# Altium footprint library mastermind.PCBLIB: 1061 footprints (part 10 of 67)
Each footprint in its own frame and in the unit in brackets; x right, y up, seen from the top. Pads: shape width x height; smd on the part's side, far side on the other; paste and mask are expansions set on the pad; w line width, h text height; cw(c..) or ccw(c..) is an arc to the next point about the centre after c.
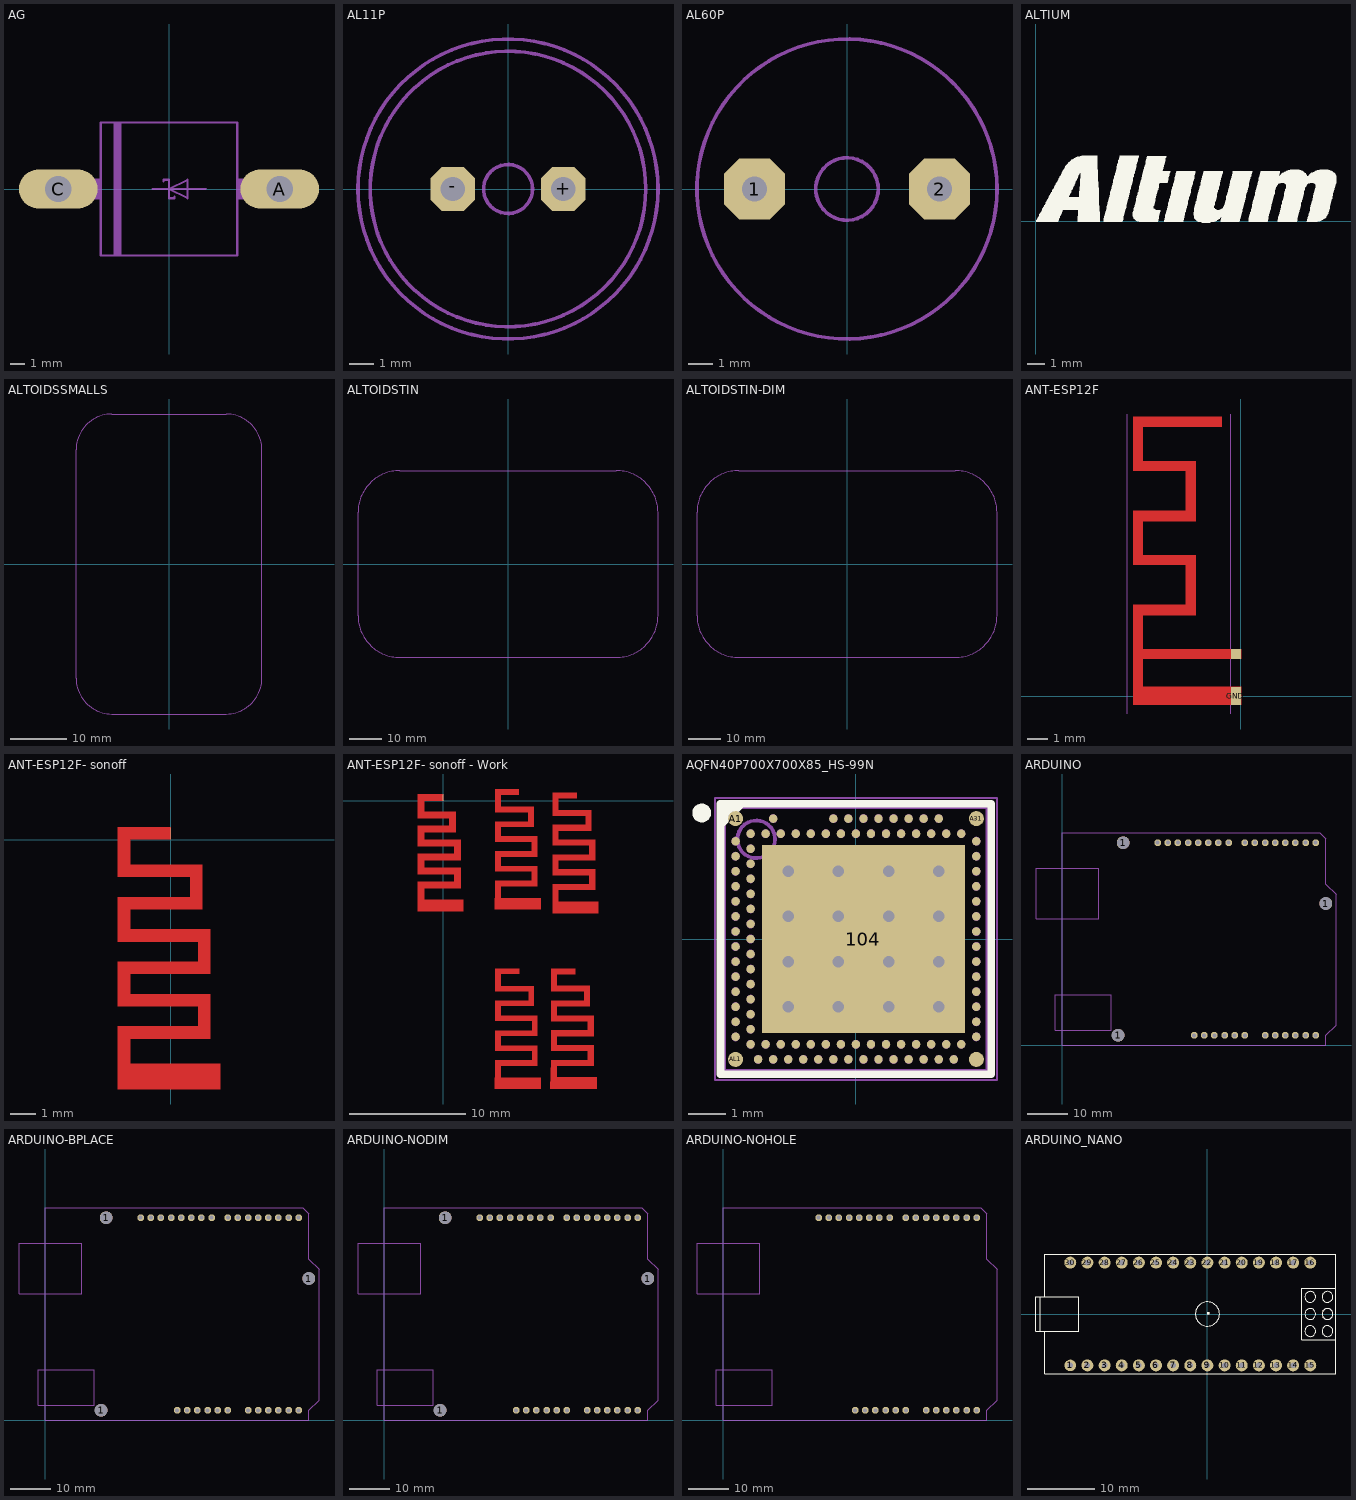
[diagram p9: the footprints below, top view; thin cyan lines are the x and y axes]

## AG [mil]
pads (2):
  oval 213x106.5 hole 71: A(300,0) C(-300,0)
Mechanical 2:
  region: -221,-28 -221,28 -185,28 -185,-28
  region: 185,-28 185,28 221,28 221,-28
  region: -150,-180 -150,180 -130,180 -130,-180
  lines w6: -45,0 0,0 ; -15,20 -15,25 0,25 0,0 ; 15,-20 15,-25 0,-25 0,0 ; 100,0 0,0 ; 0,0 50,-25 50,25 0,0 ; -185,-180 185,-180 185,180 -185,180 -185,-180
Mechanical 8:
  lines w58: -300,0 -230,0 ; 230,0 300,0

## AL11P [mil]
pads (2):
  oct 72.62x72.62 hole 40: +(90,0) -(-90,0)
Mechanical 2:
  circle w6: c0,0 r40
  circle w6: c0,0 r245
  circle w6: c0,0 r225

## AL60P [mil]
pads (2):
  oct 96.82x96.82 hole 40: 1(-148,0) 2(148,0)
Mechanical 2:
  circle w6: c0,0 r240
  circle w6: c0,0 r50

## ALTIUM [mm]
Top Overlay:
  drawing of 1207 lines, arcs and shapes, not listed

## ALTOIDSSMALLS [mm]
Mechanical 2:
  lines w0: -16.51,-20.32 ccw(c-10.16,-20.32) -10.16,-26.67 10.16,-26.67 ccw(c10.16,-20.32) 16.51,-20.32 16.51,20.32 ccw(c10.16,20.32) 10.16,26.67 -10.16,26.67 ccw(c-10.16,20.32) -16.51,20.32 -16.51,-20.32

## ALTOIDSTIN [mm]
Mechanical 2:
  lines w0.127: -45.72,-15.748 ccw(c-33.02,-15.748) -33.02,-28.448 33.02,-28.448 ccw(c33.02,-15.748) 45.72,-15.748 45.72,15.748 ccw(c33.02,15.748) 33.02,28.448 -33.02,28.448 ccw(c-33.02,15.748) -45.72,15.748 -45.72,-15.748

## ALTOIDSTIN-DIM [mm]
Mechanical 1:
  lines w0.127: -45.72,-15.748 ccw(c-33.02,-15.748) -33.02,-28.448 33.02,-28.448 ccw(c33.02,-15.748) 45.72,-15.748 45.72,15.748 ccw(c33.02,15.748) 33.02,28.448 -33.02,28.448 ccw(c-33.02,15.748) -45.72,15.748 -45.72,-15.748

## ANT-ESP12F [mm]
pads (2):
  rect 0.5x0.5 smd paste+0 mask+0: ANT(-0.25,2.1)
  rect 0.5x0.9 smd paste+0 mask+0: GND(-0.25,0)
Top Layer:
  region: 0,1.85 -4.9,1.85 -4.9,0.45 0,0.45 0,-0.45 -5.4,-0.45 -5.4,4.55 -2.76,4.55 -2.76,6.55 -5.4,6.55 -5.4,9.25 -2.76,9.25 -2.76,11.25 -5.4,11.25 -5.4,13.95 -0.96,13.95 -0.96,13.45 -4.9,13.45 -4.9,11.75 -2.26,11.75 -2.26,8.75 -4.9,8.75 -4.9,7.05 -2.26,7.05 -2.26,4.05 -4.9,4.05 -4.9,2.35 0,2.35
Mechanical 3:
  lines w0.05: -5.7,-0.9 -5.7,14.1 ; -0.5,-0.9 -0.5,14.1
  text "Ground Plane" at 0.3,3.1 h0.54

## ANT-ESP12F- sonoff [mm]
pads (1):
  rect 0.025x0.48 smd paste-0.013 mask-0.013: FEED(-0.013,0.242)
Top Layer:
  region: 0,0.48 0,0 -1.6,0 -1.6,-1 1.26,-1 1.26,-2.76 -1.6,-2.76 -1.6,-3.56 1.57,-3.56 1.57,-5.321 -1.6,-5.321 -1.6,-6.121 1.57,-6.121 1.57,-7.882 -1.6,-7.882 -1.6,-8.88 1.96,-8.88 1.96,-9.88 -2.08,-9.88 -2.08,-7.402 1.09,-7.401 1.09,-6.601 -2.08,-6.601 -2.08,-4.84 1.09,-4.84 1.09,-4.04 -2.08,-4.04 -2.08,-2.28 0.78,-2.28 0.78,-1.48 -2.08,-1.48 -2.08,0.48
Bottom Layer:
  pour cut-out: 0.2,2

## ANT-ESP12F- sonoff - Work [mm]
pads (1):
  rect 0.025x0.56 smd paste-0.013 mask-0.013: FEED(-0.013,0.28)
Top Layer:
  region: 4.96,-23.784 4.96,-22.784 4.48,-22.784 4.48,-23.784
  rectangle: 4.48,-17.662 7.82,-17.182
  rectangle: 4.48,-18.943 8.13,-18.463
  rectangle: 4.48,-20.223 8.13,-19.743
  rectangle: 4.48,-21.503 8.13,-21.023
  rectangle: 4.48,-14.902 6.56,-14.422
  rectangle: 4.42,-24.782 8.42,-23.782
  rectangle: 4.48,-22.784 8.13,-22.304
  region: 4.96,-15.902 4.96,-14.902 4.48,-14.902 4.48,-15.902
  rectangle: 4.48,-16.382 7.82,-15.902
  region: 7.34,-16.382 7.34,-17.182 7.82,-17.182 7.82,-16.382
  region: 4.96,-18.463 4.96,-17.663 4.48,-17.663 4.48,-18.463
  region: 7.65,-18.943 7.65,-19.743 8.13,-19.743 8.13,-18.943
  region: 4.96,-21.023 4.96,-20.223 4.48,-20.223 4.48,-21.023
  region: 7.65,-21.503 7.65,-22.303 8.13,-22.303 8.13,-21.503
  region: 7.3,-0.752 7.3,-1.752 7.8,-1.752 7.8,-0.752
  region: 7.61,-3.304 7.61,-4.304 8.11,-4.304 8.11,-3.304
  region: 7.61,-5.856 7.61,-6.856 8.11,-6.856 8.11,-5.856
  region: 4.96,-8.356 4.96,-7.356 4.46,-7.356 4.46,-8.356
  region: 4.96,-5.68 4.96,-4.68 4.46,-4.68 4.46,-5.68
  region: 4.96,-3.252 4.96,-2.252 4.46,-2.252 4.46,-3.252
  rectangle: 4.46,-2.252 7.8,-1.752
  rectangle: 4.46,-3.528 8.11,-3.028
  rectangle: 4.46,-4.804 8.11,-4.304
  rectangle: 4.46,-6.08 8.11,-5.58
  rectangle: 4.46,0.524 6.54,1.024
  rectangle: 4.4,-9.356 8.4,-8.356
  rectangle: 4.46,-7.356 8.11,-6.856
  region: 4.96,-0.476 4.96,0.524 4.46,0.524 4.46,-0.476
  rectangle: 4.46,-0.976 7.8,-0.476
  region: 11.367,-14.422 11.367,-14.902 9.767,-14.902 9.767,-15.902 12.627,-15.902 12.627,-17.663 9.767,-17.663 9.767,-18.463 12.937,-18.463 12.937,-20.223 9.767,-20.223 9.767,-21.023 12.937,-21.023 12.937,-22.784 9.767,-22.784 9.767,-23.782 13.227,-23.782 13.227,-24.782 9.227,-24.782 9.287,-22.304 12.457,-22.303 12.457,-21.503 9.287,-21.503 9.287,-19.743 12.457,-19.743 12.457,-18.943 9.287,-18.943 9.287,-17.182 12.147,-17.182 12.147,-16.382 9.287,-16.382 9.287,-14.422
  region: 0,0.56 -2.2,0.56 -2.2,-1.5 0.54,-1.5 0.54,-2.14 -2.2,-2.14 -2.2,-3.9 0.965,-3.9 0.965,-4.54 -2.2,-4.54 -2.2,-6.3 0.965,-6.3 0.965,-6.94 -2.2,-6.94 -2.2,-9.5 1.74,-9.5 1.74,-8.5 -1.64,-8.5 -1.64,-7.5 1.525,-7.5 1.525,-5.74 -1.64,-5.74 -1.64,-5.1 1.525,-5.1 1.525,-3.34 -1.64,-3.34 -1.64,-2.7 1.1,-2.7 1.1,-0.94 -1.64,-0.94 -1.64,0 0,0
  region: 11.502,0.717 11.502,0.217 9.922,0.217 9.922,-0.783 12.762,-0.783 12.762,-2.559 9.922,-2.559 9.922,-3.335 13.072,-3.335 13.072,-5.111 9.922,-5.111 9.922,-5.887 13.072,-5.887 13.072,-7.663 9.922,-7.663 9.922,-8.663 13.362,-8.663 13.362,-9.663 9.422,-9.663 9.422,-7.163 12.572,-7.163 12.572,-6.387 9.422,-6.387 9.422,-4.611 12.572,-4.611 12.572,-3.835 9.422,-3.835 9.422,-2.059 12.262,-2.059 12.262,-1.272 9.422,-1.272 9.422,0.717

## AQFN40P700X700X85_HS-99N [mm] "AQFN, 98-Leads, Body 7.00x7.00mm, Pitch 0.40mm, Thermal Pad 5.4x5.0mm, IPC Medium Density"
height 0.85
pads (115):
  rect 5.4x5 smd paste-5 mask+0.05: 104(0.2,0)
  round 0.4 smd paste+0.012 mask+0.05: A1(-3.2,3.2) A31(3.2,3.2) AL1(-3.2,-3.2) AL31(3.2,-3.2)
  round 0.225 smd paste+0.012 mask+0.05: A5(-2.2,3.2) A13(-0.6,3.2) A15(-0.2,3.2) A17(0.2,3.2) A19(0.6,3.2) A21(1,3.2) A23(1.4,3.2) A25(1.8,3.2) A27(2.2,3.2) AA1(-3.2,-1) AA31(3.2,-1) AB2(-2.8,-1.2) AC1(-3.2,-1.4) AC31(3.2,-1.4) AD2(-2.8,-1.6) AE1(-3.2,-1.8) AE31(3.2,-1.8) AF2(-2.8,-2) AG1(-3.2,-2.2) AG31(3.2,-2.2) AH2(-2.8,-2.4) AJ1(-3.2,-2.6) AJ31(3.2,-2.6) AK2(-2.8,-2.8) AK4(-2.4,-2.8) AK6(-2,-2.8) AK8(-1.6,-2.8) AK10(-1.2,-2.8) AK12(-0.8,-2.8) AK14(-0.4,-2.8) AK16(0,-2.8) AK18(0.4,-2.8) AK20(0.8,-2.8) AK22(1.2,-2.8) AK24(1.6,-2.8) AK26(2,-2.8) AK28(2.4,-2.8) AK30(2.8,-2.8) AL3(-2.6,-3.2) AL5(-2.2,-3.2) AL7(-1.8,-3.2) AL9(-1.4,-3.2) AL11(-1,-3.2) AL13(-0.6,-3.2) AL15(-0.2,-3.2) AL17(0.2,-3.2) AL19(0.6,-3.2) AL21(1,-3.2) AL23(1.4,-3.2) AL25(1.8,-3.2) AL27(2.2,-3.2) AL29(2.6,-3.2) B2(-2.8,2.8) B4(-2.4,2.8) B6(-2,2.8) B8(-1.6,2.8) B10(-1.2,2.8) B12(-0.8,2.8) B14(-0.4,2.8) B16(0,2.8) B18(0.4,2.8) B20(0.8,2.8) B22(1.2,2.8) B24(1.6,2.8) B26(2,2.8) B28(2.4,2.8) B30(2.8,2.8) C1(-3.2,2.6) C31(3.2,2.6) D2(-2.8,2.4) E1(-3.2,2.2) E31(3.2,2.2) F2(-2.8,2) G1(-3.2,1.8) G31(3.2,1.8) H2(-2.8,1.6) J1(-3.2,1.4) J31(3.2,1.4) K2(-2.8,1.2) L1(-3.2,1) L31(3.2,1) M2(-2.8,0.8) N1(-3.2,0.6) N31(3.2,0.6) P2(-2.8,0.4) R1(-3.2,0.2) R31(3.2,0.2) T2(-2.8,0) U1(-3.2,-0.2) U31(3.2,-0.2) V2(-2.8,-0.4) W1(-3.2,-0.6) W31(3.2,-0.6) Y2(-2.8,-0.8)
  rrect15% 1.1x1 on Top Paste: ""(-1.75,-1.8) ""(-1.75,-0.6) ""(-1.75,0.6) ""(-1.75,1.8) ""(-0.45,-1.8) ""(-0.45,-0.6) ""(-0.45,0.6) ""(-0.45,1.8) ""(0.85,-1.8) ""(0.85,-0.6) ""(0.85,0.6) ""(0.85,1.8) ""(2.15,-1.8) ""(2.15,-0.6) ""(2.15,0.6) ""(2.15,1.8)
via 2.2,-1.8 diameter 0.61 hole 0.305
via 0.867,-1.8 diameter 0.61 hole 0.305
via -0.467,-1.8 diameter 0.61 hole 0.305
via -1.8,-1.8 diameter 0.61 hole 0.305
via 2.2,-0.6 diameter 0.61 hole 0.305
via 0.867,-0.6 diameter 0.61 hole 0.305
via -0.467,-0.6 diameter 0.61 hole 0.305
via -1.8,-0.6 diameter 0.61 hole 0.305
via 2.2,0.6 diameter 0.61 hole 0.305
via 0.867,0.6 diameter 0.61 hole 0.305
via -0.467,0.6 diameter 0.61 hole 0.305
via -1.8,0.6 diameter 0.61 hole 0.305
via 2.2,1.8 diameter 0.61 hole 0.305
via 0.867,1.8 diameter 0.61 hole 0.305
via -0.467,1.8 diameter 0.61 hole 0.305
via -1.8,1.8 diameter 0.61 hole 0.305
Top Overlay:
  circle w0.25: c-4.1,3.35 r0.125
  region: -3,3.5 -3.5,3 -3.5,3.5
  lines w0.2: -3.6,-3.6 3.6,-3.6 3.6,3.6 -3.6,3.6 -3.6,-3.6
Mechanical 5:
  drawing of 564 lines, arcs and shapes, not listed
  text "B16" at -0.098,2.961 h0.08
  text "B26" at 1.902,2.961 h0.08
  text "AK16" at -0.138,-3.039 h0.08
  text "AK26" at 1.862,-3.039 h0.08
  text "B6" at -2.069,2.961 h0.08
  text "AK6" at -2.108,-3.039 h0.08
  text "T2" at -3.128,-0.04 h0.08
  text "F2" at -3.128,1.96 h0.08
  text "AF2" at -3.208,-2.04 h0.08
  text "B28" at 2.302,2.961 h0.08
  text "A27" at 2.098,3.361 h0.08
  text "B30" at 2.702,2.961 h0.08
  text "C31" at 3.322,2.56 h0.08
  text "E31" at 3.322,2.16 h0.08
  text "N31" at 3.322,0.56 h0.08
  text "R31" at 3.322,0.16 h0.08
  text "L31" at 3.322,0.96 h0.08
  text "G31" at 3.322,1.76 h0.08
  text "J31" at 3.322,1.36 h0.08
  text "AE31" at 3.322,-1.84 h0.08
  text "AC31" at 3.322,-1.44 h0.08
  text "W31" at 3.322,-0.64 h0.08
  text "AA31" at 3.322,-1.04 h0.08
  text "U31" at 3.322,-0.24 h0.08
  text "AK30" at 2.662,-3.039 h0.08
  text "AJ31" at 3.322,-2.64 h0.08
  text "AG31" at 3.322,-2.24 h0.08
  text "AK28" at 2.262,-3.039 h0.08
  text "AL27" at 2.056,-3.439 h0.08
  text "AL29" at 2.456,-3.439 h0.08
  text "B22" at 1.102,2.961 h0.08
  text "A19" at 0.498,3.361 h0.08
  text "A17" at 0.098,3.361 h0.08
  text "B18" at 0.302,2.961 h0.08
  text "A21" at 0.898,3.36 h0.08
  text "B20" at 0.702,2.961 h0.08
  text "A25" at 1.698,3.361 h0.08
  text "A23" at 1.298,3.36 h0.08
  text "B24" at 1.502,2.961 h0.08
  text "AK22" at 1.062,-3.039 h0.08
  text "AL19" at 0.456,-3.439 h0.08
  text "AL17" at 0.056,-3.439 h0.08
  text "AK18" at 0.262,-3.039 h0.08
  text "AL21" at 0.856,-3.439 h0.08
  text "AK20" at 0.662,-3.04 h0.08
  text "AL25" at 1.656,-3.439 h0.08
  text "AL23" at 1.256,-3.439 h0.08
  text "AK24" at 1.462,-3.039 h0.08
  text "A15" at -0.302,3.361 h0.08
  text "B8" at -1.669,2.961 h0.08
  text "B12" at -0.898,2.961 h0.08
  text "B10" at -1.298,2.961 h0.08
  text "A13" at -0.702,3.36 h0.08
  text "B14" at -0.498,2.961 h0.08
  text "AL15" at -0.344,-3.439 h0.08
  text "AL9" at -1.544,-3.439 h0.08
  text "AL7" at -1.915,-3.439 h0.08
  text "AK8" at -1.708,-3.039 h0.08
  text "AK12" at -0.938,-3.039 h0.08
  text "AL11" at -1.144,-3.439 h0.08
  text "AK10" at -1.338,-3.04 h0.08
  text "AL13" at -0.744,-3.439 h0.08
  text "AK14" at -0.538,-3.039 h0.08
  text "B2" at -2.853,2.947 h0.08
  text "A5" at -2.272,3.361 h0.08
  text "B4" at -2.469,2.961 h0.08
  text "C1" at -3.469,2.56 h0.08
  text "E1" at -3.449,2.16 h0.08
  text "D2" at -3.128,2.36 h0.08
  text "K2" at -3.128,1.16 h0.08
  text "N1" at -3.449,0.56 h0.08
  text "R1" at -3.456,0.16 h0.08
  text "P2" at -3.128,0.36 h0.08
  text "L1" at -3.489,0.96 h0.08
  text "M2" at -3.128,0.76 h0.08
  text "G1" at -3.469,1.76 h0.08
  text "J1" at -3.469,1.36 h0.08
  text "H2" at -3.128,1.56 h0.08
  text "AB2" at -3.208,-1.24 h0.08
  text "AE1" at -3.521,-1.84 h0.08
  text "AC1" at -3.541,-1.44 h0.08
  text "AD2" at -3.208,-1.64 h0.08
  text "W1" at -3.469,-0.64 h0.08
  text "AA1" at -3.534,-1.04 h0.08
  text "Y2" at -3.128,-0.84 h0.08
  text "U1" at -3.469,-0.24 h0.08
  text "V2" at -3.128,-0.44 h0.08
  text "AL3" at -2.715,-3.439 h0.08
  text "AK2" at -2.908,-3.013 h0.08
  text "AL5" at -2.315,-3.439 h0.08
  text "AK4" at -2.508,-3.039 h0.08
  text "AH2" at -3.208,-2.44 h0.08
  text "AJ1" at -3.541,-2.64 h0.08
  text "AG1" at -3.541,-2.24 h0.08
Dimensions:
  circle w0.1: c-2.65,2.65 r0.5
  lines w0.1: -3.5,-3.5 -3.5,3.5 3.5,3.5 3.5,-3.5 -3.5,-3.5
  text ".Designator" at -0.605,-0.43 h0.64
Mechanical 15:
  lines w0.05: -3.75,-3.75 -3.75,3.75 3.75,3.75 3.75,-3.75 -3.75,-3.75
  lines w0.1: -0.3,0 0.7,0 ; 0.2,-0.5 0.2,0.5
3D body "aQFN-116 (7x7).step": height 0.85, standoff -0.05, extent -3.5,-3.5 3.5,3.5

## ARDUINO [mm]
pads (31):
  round 3.2 hole 3.2: 1(13.97,2.54) 1(15.24,50.8) 1(66.04,35.56)
  oct 1.623x1.623 hole 1: 3V(35.56,2.54) 5V(38.1,2.54) A0(50.8,2.54) A1(53.34,2.54) A2(55.88,2.54) A3(58.42,2.54) A4(60.96,2.54) A5(63.5,2.54) AREF(23.876,50.8) D0(63.5,50.8) D1(60.96,50.8) D2(58.42,50.8) D3(55.88,50.8) D4(53.34,50.8) D5(50.8,50.8) D6(48.26,50.8) D7(45.72,50.8) D8(41.656,50.8) D9(39.116,50.8) D10(36.576,50.8) D11(34.036,50.8) D12(31.496,50.8) D13(28.956,50.8) GND(26.416,50.8) GND1(43.18,2.54) GND2(40.64,2.54) RESET(33.02,2.54) VIN(45.72,2.54)
Mechanical 1:
  lines w0: 0,0 66.04,0 66.04,2.54 68.58,5.08 68.58,37.846 66.04,40.386 66.04,51.816 64.516,53.34 0,53.34 0,0
Mechanical 9:
  lines w0: -6.604,31.75 -6.604,44.45 9.144,44.45 9.144,31.75 -6.604,31.75 ; -1.778,3.81 12.192,3.81 12.192,12.7 -1.778,12.7 -1.778,3.81

## ARDUINO-BPLACE [mm]
pads (31):
  round 3.2 hole 3.2: 1(13.97,2.54) 1(15.24,50.8) 1(66.04,35.56)
  oct 1.623x1.623 hole 1: 3V(35.56,2.54) 5V(38.1,2.54) A0(50.8,2.54) A1(53.34,2.54) A2(55.88,2.54) A3(58.42,2.54) A4(60.96,2.54) A5(63.5,2.54) AREF(23.876,50.8) D0(63.5,50.8) D1(60.96,50.8) D2(58.42,50.8) D3(55.88,50.8) D4(53.34,50.8) D5(50.8,50.8) D6(48.26,50.8) D7(45.72,50.8) D8(41.656,50.8) D9(39.116,50.8) D10(36.576,50.8) D11(34.036,50.8) D12(31.496,50.8) D13(28.956,50.8) GND(26.416,50.8) GND1(43.18,2.54) GND2(40.64,2.54) RESET(33.02,2.54) VIN(45.72,2.54)
Mechanical 3:
  lines w0: -6.604,31.75 -6.604,44.45 9.144,44.45 9.144,31.75 -6.604,31.75 ; -1.778,3.81 12.192,3.81 12.192,12.7 -1.778,12.7 -1.778,3.81 ; 0,0 66.04,0 66.04,2.54 68.58,5.08 68.58,37.846 66.04,40.386 66.04,51.816 64.516,53.34 0,53.34 0,0

## ARDUINO-NODIM [mm]
pads (31):
  round 3.2 hole 3.2: 1(13.97,2.54) 1(15.24,50.8) 1(66.04,35.56)
  oct 1.623x1.623 hole 1: 3V(35.56,2.54) 5V(38.1,2.54) A0(50.8,2.54) A1(53.34,2.54) A2(55.88,2.54) A3(58.42,2.54) A4(60.96,2.54) A5(63.5,2.54) AREF(23.876,50.8) D0(63.5,50.8) D1(60.96,50.8) D2(58.42,50.8) D3(55.88,50.8) D4(53.34,50.8) D5(50.8,50.8) D6(48.26,50.8) D7(45.72,50.8) D8(41.656,50.8) D9(39.116,50.8) D10(36.576,50.8) D11(34.036,50.8) D12(31.496,50.8) D13(28.956,50.8) GND(26.416,50.8) GND1(43.18,2.54) GND2(40.64,2.54) RESET(33.02,2.54) VIN(45.72,2.54)
Mechanical 9:
  lines w0: -6.604,31.75 9.144,31.75 9.144,44.45 -6.604,44.45 -6.604,31.75 ; -1.778,3.81 -1.778,12.7 12.192,12.7 12.192,3.81 -1.778,3.81 ; 0,0 0,53.34 64.516,53.34 66.04,51.816 66.04,40.386 68.58,37.846 68.58,5.08 66.04,2.54 66.04,0 0,0

## ARDUINO-NOHOLE [mm]
pads (28):
  oct 1.623x1.623 hole 1: 3V(35.56,2.54) 5V(38.1,2.54) A0(50.8,2.54) A1(53.34,2.54) A2(55.88,2.54) A3(58.42,2.54) A4(60.96,2.54) A5(63.5,2.54) AREF(23.876,50.8) D0(63.5,50.8) D1(60.96,50.8) D2(58.42,50.8) D3(55.88,50.8) D4(53.34,50.8) D5(50.8,50.8) D6(48.26,50.8) D7(45.72,50.8) D8(41.656,50.8) D9(39.116,50.8) D10(36.576,50.8) D11(34.036,50.8) D12(31.496,50.8) D13(28.956,50.8) GND(26.416,50.8) GND1(43.18,2.54) GND2(40.64,2.54) RESET(33.02,2.54) VIN(45.72,2.54)
Mechanical 3:
  lines w0: -6.604,31.75 -6.604,44.45 9.144,44.45 9.144,31.75 -6.604,31.75 ; -1.778,3.81 12.192,3.81 12.192,12.7 -1.778,12.7 -1.778,3.81 ; 0,0 66.04,0 66.04,2.54 68.58,5.08 68.58,37.846 66.04,40.386 66.04,51.816 64.516,53.34 0,53.34 0,0

## ARDUINO_NANO [mil]
pads (30):
  round 67.78 hole 31.5: 1(-800,-300)
  round 70 / inner round 60 / far side round 70 hole 31.5: 2(-700,-300) 3(-600,-300) 4(-500,-300) 5(-400,-300) 6(-300,-300) 7(-200,-300) 8(-100,-300) 9(0,-300) 10(100,-300) 11(200,-300) 12(300,-300) 13(400,-300) 14(500,-300) 15(600,-300) 16(600,300) 17(500,300) 18(400,300) 19(300,300) 20(200,300) 21(100,300) 22(0,300) 23(-100,300) 24(-200,300) 25(-300,300) 26(-400,300) 27(-500,300) 28(-600,300) 29(-700,300) 30(-800,300)
Top Overlay:
  circle w5: c0,0 r70.71
  circle w5: c600,-100 r31.5
  circle w5: c700,-100 r31.5
  circle w5: c600,0 r31.5
  circle w5: c700,0 r31.5
  circle w5: c700,100 r31.5
  circle w5: c600,100 r31.5
  region: 0,0 10,0 10,10 0,10
  lines w5: -975,-100 -975,100 ; -950,-100 -950,-350 -900,-350 700,-350 750,-350 750,-300 750,-150 ; -950,100 -750,100 -750,-100 -1000,-100 -1000,100 -950,100 ; -950,100 -950,350 700,350 750,350 750,300 750,150 ; 750,-150 750,150 ; 750,-150 550,-150 550,150 750,150
Mechanical 22:
  circle w5: c700,0 r31.5
  region: 0,0 10,0 10,10 0,10
3D body "15-Pin Header - Female - 2.54mm.step": height 196.85, standoff -118.11, extent -858.27,-342.52 661.42,-244.09
3D body "15-Pin Header - Female - 2.54mm.step": height 196.85, standoff -118.11, extent -858.27,251.97 661.42,350.39